# Altium footprint library AHMET_CAN_KARACAN.PcbL.PcbLib: 65 footprints (part 1 of 5)
Each footprint in its own frame and in the unit in brackets; x right, y up, seen from the top. Pads: shape width x height; smd on the part's side, far side on the other; paste and mask are expansions set on the pad; w line width, h text height; cw(c..) or ccw(c..) is an arc to the next point about the centre after c.
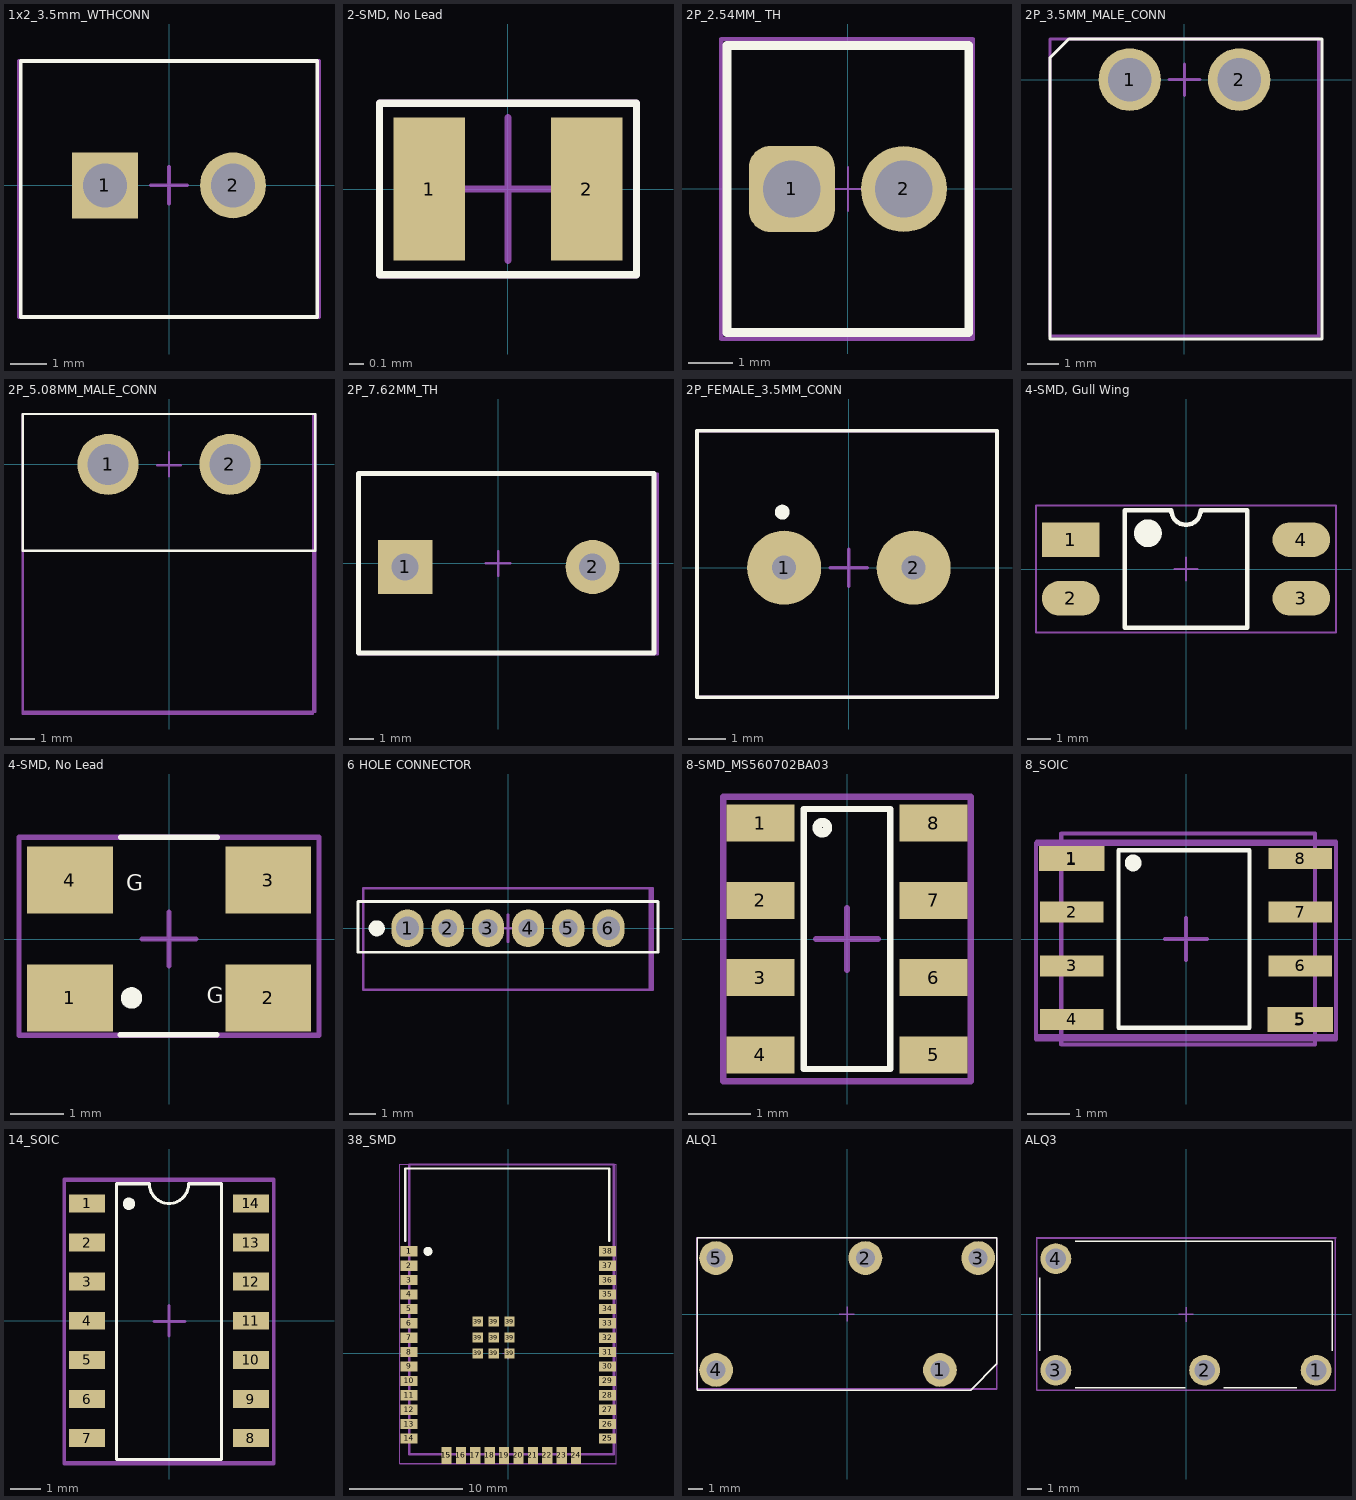
[diagram p0: the footprints below, top view; thin cyan lines are the x and y axes]

## 1x2_3.5mm_WTHCONN [mm]
pads (2):
  rect 1.8x1.8 hole 1.2: 1(-1.75,0)
  round 1.8 hole 1.2: 2(1.75,0)
Top Overlay:
  lines w0.1: -4.05,-3.6 4.05,-3.6 4.05,3.4 -4.05,3.4 -4.05,-3.6
Top Component Center:
  lines w0.1: -0.5,0 0.5,0 ; 0,-0.5 0,0.5 ; -4.1,-3.6 4.1,-3.6 4.1,3.4 -4.1,3.4 -4.1,-3.6
Top Designator:
  lines w0.1: -4.1,-3.6 -4.1,3.4 4.1,3.4 4.1,-3.6 -4.1,-3.6
  text ".Designator" at -2.25,-1.004 h2.54
3D body "CON_1x2_3.5mm.STEP": height 8.4, standoff -3.8, extent -4,-3.6 4,3.4

## 2-SMD, No Lead [mm]
pads (2):
  rect 0.5x1 smd mask+0.05: 1(-0.55,0) 2(0.55,0)
Top Overlay:
  lines w0.05: -0.9,-0.6 -0.9,0.6 0.9,0.6 0.9,-0.6 -0.9,-0.6
Top Component Center:
  lines w0.05: -0.5,0 0.5,0 ; 0,-0.5 0,0.5 ; -0.9,-0.6 -0.9,0.6 0.9,0.6 0.9,-0.6 -0.9,-0.6
Top Designator:
  lines w0.05: -0.9,-0.6 -0.9,0.6 0.9,0.6 0.9,-0.6 -0.9,-0.6
3D body "2_SMD_NO_LEAD.STEP": height 0.5, standoff 0, extent -0.8,-0.5 0.8,0.5

## 2P_2.54MM_ TH [mm]
pads (2):
  rrect50% 1.95x1.95 hole 1.3: 1(-1.27,0)
  round 1.95 hole 1.3: 2(1.27,0)
Top Overlay:
  lines w0.2: -2.74,-3.25 2.74,-3.25 2.74,3.25 -2.74,3.25 -2.74,-3.25
Top Component Center:
  lines w0.05: -0.5,0 0.5,0 ; 0,-0.5 0,0.5 ; -2.87,-3.3 2.83,-3.3 2.83,3.4 -2.87,3.4 -2.87,-3.3
Top Designator:
  lines w0.1: -2.87,-3.4 -2.87,3.4 2.83,3.4 2.83,-3.4 -2.87,-3.4
  text ".Designator" at -0.92,-0.283 h0.8
3D body "691210910002.stp": height 8.55, standoff -3.45, extent -2.74,-3.25 2.74,3.25

## 2P_3.5MM_MALE_CONN [mm]
pads (2):
  round 2 hole 1.4 mask+0.05: 1(-1.75,0) 2(1.75,0)
Top Overlay:
  lines w0.1: -4.3,-8.3 -4.3,0.7 -3.7,1.3 4.4,1.3 4.4,-8.3 -4.3,-8.3
Top Component Center:
  lines w0.1: -0.5,0 0.5,0 ; 0,-0.5 0,0.5 ; -4.3,-8.2 4.3,-8.2 4.3,1.3 -4.3,1.3 -4.3,-8.2
Top Designator:
  lines w0.1: -4.3,-8.2 4.3,-8.2 4.3,1.3 -4.3,1.3 -4.3,-8.2
  text ".Designator" at -0.95,-0.417 h1
3D body "2P_3.5MM_MALE_CONN.stp": height 7.35, standoff -3.35, extent -4.2,-8 4.2,1.2

## 2P_5.08MM_MALE_CONN [mm]
pads (2):
  round 2.55 hole 1.7: 1(-2.54,0) 2(2.54,0)
Top Overlay:
  lines w0.1: -6.1,-3.6 -6.1,2.1 6.1,2.1 6.1,-3.6 -6.1,-3.6
Top Component Center:
  lines w0.1: -0.499,-0.032 0.501,-0.032 ; 0,-0.5 0,0.5 ; -6.1,-10.4 -6.1,2.1 6,2.1 6,-10.4 -6.1,-10.4
Top Designator:
  lines w0.1: -6.1,-10.3 -6.1,2.1 6.1,2.1 6.1,-10.3 -6.1,-10.3
  text ".Designator" at -2.046,-0.638 h1.52
3D body "TBP01R1_508_02BE.step": height 8.55, standoff -3.95, extent -5.9,-10.1 5.86,1.9

## 2P_7.62MM_TH [mm]
pads (2):
  rect 2.2x2.2 hole 1.1: 1(-3.78,-0.143)
  round 2.2 hole 1.1: 2(3.84,-0.143)
Top Overlay:
  lines w0.2: -5.685,-3.643 -5.685,3.657 6.345,3.657 6.345,3.272 6.345,2.242 6.345,-1.463 6.345,-2.143 6.345,-3.643 -5.685,-3.643
Top Component Center:
  lines w0.1: -0.5,0 0.5,0 ; 0,-0.5 0,0.5 ; -5.685,-3.7 6.5,-3.7 6.5,-2.3 6.5,3.097 6.5,3.657 -5.685,3.657 -5.685,-3.7
Top Designator:
  lines w0.1: -5.7,-3.7 6.4,-3.7 6.4,3.6 -5.7,3.6 -5.7,-3.7
  text ".Designator" at -0.45,-0.283 h0.8
3D body "691214410002.stp": height 9.2, standoff -3.4, extent -5.685,-3.643 6.345,3.657

## 2P_FEMALE_3.5MM_CONN [mm]
pads (2):
  round 2 hole 0.65: 1(-1.75,0) 2(1.75,0)
Top Overlay:
  circle w0.2: c-1.8,1.5 r0.1
  lines w0.1: -4.1,-3.5 -4.1,3.7 4,3.7 4,-3.5 -4.1,-3.5
Top Component Center:
  lines w0.1: -0.5,0 0.5,0 ; 0,-0.5 0,0.5 ; -4.1,-3.5 4,-3.5 4,3.7 -4.1,3.7 -4.1,-3.5
Top Designator:
  lines w0.1: -4.1,-3.5 4,-3.5 4,3.7 -4.1,3.7 -4.1,-3.5
  text ".Designator" at -1.55,-0.417 h1
3D body "terminal_blocks_a-tb350-te02.stp": height 8.9, standoff -3.29, extent -4.05,-3.4 3.944,3.6

## 4-SMD, Gull Wing [mm]
pads (4):
  rect 2.5x1.5 smd: 1(-5,1.27)
  oval 2.5x1.5 smd: 2(-5,-1.27) 3(5,-1.27) 4(5,1.27)
Top Overlay:
  circle w0.6: c-1.65,1.55 r0.3
  lines w0.2: -2.65,-2.55 -2.65,2.55 -0.635,2.55 ccw(c0,2.55) 0.635,2.55 2.65,2.55 2.65,-2.55 -2.65,-2.55
Top Component Center:
  lines w0.1: -0.5,0 0.5,0 ; 0,-0.5 0,0.5 ; -6.5,-2.75 6.5,-2.75 6.5,2.75 -6.5,2.75 -6.5,-2.75
Top Designator:
  lines w0.1: -6.5,-2.75 6.5,-2.75 6.5,2.75 -6.5,2.75 -6.5,-2.75
  text ".Designator" at -0.75,-0.233 h0.8
3D body "TPC817S1A_RAG.stp": height 3.88, standoff 0, extent -5.127,-2.314 4.923,2.286

## 4-SMD, No Lead [mm]
pads (4):
  rect 1.6x1.25 smd mask+0.05: 1(-1.85,-1.1) 2(1.85,-1.1) 3(1.85,1.1) 4(-1.85,1.1)
Top Overlay:
  circle w0.2: c-0.7,-1.1 r0.1
  lines w0.1: -0.907,-1.788 0.893,-1.788 ; -0.9,1.9 0.9,1.9
  text "G" at -0.8,0.9 h0.3
  text "G" at 0.7,-1.2 h0.3
Top Component Center:
  lines w0.1: -0.5,0 0.5,0 ; 0,-0.5 0,0.5 ; -2.8,-1.8 -2.8,1.9 2.8,1.9 2.8,-1.8 -2.8,-1.8
Top Designator:
  lines w0.1: -2.8,-1.8 -2.8,1.9 2.8,1.9 2.8,-1.8 -2.8,-1.8
  text ".Designator" at -0.88,-0.33 h0.75
3D body "4_SMD_NO_LEAD.STEP": height 0.85, standoff 0, extent -2.5,-1.6 2.5,1.6

## 6 HOLE CONNECTOR [mm] "1.5MM"
pads (6):
  oval 1.2x1.4 hole 0.87 mask+0.05: 1(-3.75,0) 6(3.75,0)
  oval 1.2x1.4 hole 0.7 mask+0.05: 2(-2.25,0) 3(-0.75,0) 4(0.75,0) 5(2.25,0)
Top Overlay:
  circle w0.3: c-4.9,0 r0.15
  lines w0.1: -5.6,-0.9 -5.6,1 5.6,1 5.6,-0.9 -5.6,-0.9
Top Component Center:
  lines w0.1: -0.5,0 0.5,0 ; 0,-0.5 0,0.5 ; -5.4,-2.3 -5.4,1.5 5.3,1.5 5.3,-2.3 -5.4,-2.3
Top Designator:
  lines w0.1: -5.4,-2.3 -5.4,1.5 5.4,1.5 5.4,-2.3 -5.4,-2.3
  text ".Designator" at -2.346,-0.838 h1.52
3D body "6_HOLE_CONN_1.5MM.stp": height 4.95, standoff -2.25, extent -5.25,-1.3 5.25,2.2

## 8-SMD_MS560702BA03 [mm] "TSQFP, 48-Leads, Body 7,00x7,00mm, Pitch 0,50mm, IPC Medium Density"
height 1.6
pads (8):
  rect 1.1x0.6 smd mask+0.05: 1(-1.4,1.875) 2(-1.4,0.625) 3(-1.4,-0.625) 4(-1.4,-1.875) 5(1.4,-1.875) 6(1.4,-0.625) 7(1.4,0.625) 8(1.4,1.875)
Top Overlay:
  circle w0.15: c-0.4,1.8 r0.085
  lines w0.1: -0.7,-2.1 0.7,-2.1 0.7,2.1 -0.7,2.1 -0.7,-2.1
Top Component Center:
  lines w0.1: -0.5,0 0.5,0 ; 0,-0.5 0,0.5 ; -2,-2.3 2,-2.3 2,2.3 -2,2.3 -2,-2.3
Top Designator:
  lines w0.1: -2,-2.3 2,-2.3 2,2.3 -2,2.3 -2,-2.3
  text ".Designator" at -1.15,-0.65 h1.5
3D body "MS560702BA03-50--3DModel-STEP-1.STEP": height 0.98, standoff 0.03, extent -1.5,-2.5 1.5,2.5

## 8_SOIC [mm]
pads (10):
  rect 1.5x0.5 smd mask+0.05: 1(-2.7,1.905) 2(-2.7,0.635) 3(-2.7,-0.635) 4(-2.7,-1.905) 5(2.7,-1.905) 6(2.7,-0.635) 7(2.7,0.635) 8(2.7,1.905)
  rect 1.55x0.6 smd mask+0.05: 1(-2.7,1.905) 5(2.7,-1.905)
Top Overlay:
  circle w0.254: c-1.25,1.8 r0.071
  lines w0.1: -1.5,2.1 -1.6,2.1 ; -1.6,2.1 -1.6,-2.1 1.5,-2.1 1.5,2.1 -1.6,2.1
Top 3D Body:
  lines w0.1: -2.95,-2.5 3.05,-2.5 3.05,-1.25 3.05,1.25 3.05,2.5 -2.9,2.5 -2.95,2.5 -2.95,-2.5
Top Component Center:
  lines w0.1: -3.55,-2.325 -3.55,-1.188 -3.55,1.087 -3.55,2.225 ; -3.55,-2.3 3.55,-2.3 3.55,2.25 -3.55,2.25 ; -0.5,0 0.5,0 ; 0,-0.5 0,0.5
Top Designator:
  circle w0.254: c-2.8,1.9 r0.112
  lines w0.1: -3.55,-2.375 -3.55,-1.213 -3.55,1.112 -3.55,2.275 -3.525,2.3 3.55,2.3 3.55,1.138 3.55,-1.188 3.55,-2.375 -3.55,-2.375
  text ".Designator" at -0.896,-0.313 h1
3D body "SOIC_8.STEP": height 1.74, standoff -0.01, extent -2.997,-2.451 2.997,2.451

## 14_SOIC [mm]
pads (16):
  rect 1.18x0.58 smd mask+0.05: 1(-2.66,3.81) 1(-2.66,3.81) 2(-2.66,2.54) 3(-2.66,1.27) 4(-2.66,0) 5(-2.66,-1.27) 6(-2.66,-2.54) 7(-2.66,-3.81) 8(2.66,-3.81) 9(2.66,-2.54) 10(2.66,-1.27) 11(2.66,0) 12(2.66,1.27) 13(2.66,2.54) 14(2.66,3.81) 14(2.66,3.81)
Top Overlay:
  circle w0.2: c-1.3,3.8 r0.1
  lines w0.1: -1.7,-4.5 -1.7,4.45 -0.64,4.45 ccw(c0,4.45) 0.64,4.45 1.7,4.45 1.7,-4.5 -1.7,-4.5
Top Component Center:
  lines w0.1: -0.488,-0.021 0.512,-0.021 ; 0,-0.5 0,0.5 ; -3.4,-4.65 -3.4,4.55 3.4,4.55 3.4,-4.65 -3.4,-4.65
Top Designator:
  lines w0.1: -3.4,-4.6 -3.4,4.6 3.4,4.6 3.4,-4.6 -3.4,-4.6
  text ".Designator" at -1.346,-0.538 h1.52
3D body "SOIC_14.STEP": height 1.5, standoff 0, extent -3.05,-4.525 2.95,4.425

## 38_SMD [mm]
pads (50):
  rect 1.5x0.9 smd mask+0.05: 1(-8.75,9.005) 1(-8.75,9.005) 2(-8.75,7.735) 3(-8.75,6.465) 4(-8.75,5.195) 5(-8.75,3.925) 6(-8.75,2.655) 7(-8.75,1.385) 8(-8.75,0.115) 9(-8.75,-1.155) 10(-8.75,-2.425) 11(-8.75,-3.695) 12(-8.75,-4.965) 13(-8.75,-6.235) 14(-8.75,-7.505) 25(8.75,-7.505) 25(8.75,-7.505) 26(8.75,-6.235) 27(8.75,-4.965) 28(8.75,-3.695) 29(8.75,-2.425) 30(8.75,-1.155) 31(8.75,0.115) 32(8.75,1.385) 33(8.75,2.655) 34(8.75,3.925) 35(8.75,5.195) 36(8.75,6.465) 37(8.75,7.735) 38(8.75,9.005)
  rect 0.9x1.5 smd mask+0.05: 15(-5.465,-9.005) 15(-5.465,-9.005) 16(-4.195,-9.005) 17(-2.925,-9.005) 18(-1.655,-9.005) 19(-0.385,-9.005) 20(0.885,-9.005) 21(2.155,-9.005) 22(3.425,-9.005) 23(4.695,-9.005) 24(5.965,-9.005)
  rect 0.9x0.9 smd mask+0.05: 39(-2.7,0) 39(-2.7,1.4) 39(-2.7,2.8) 39(-1.3,0) 39(-1.3,1.4) 39(-1.3,2.8) 39(0.1,0) 39(0.1,1.4) 39(0.1,2.8)
Top Overlay:
  circle w0.4: c-7.1,9 r0.2
  lines w0.2: -9.1,9.9 -9.1,16.3 8.9,16.3 8.9,9.9
Top 3D Body:
  lines w0.2: -8.775,16.655 -8.74,16.655 ; -8.74,16.655 -8.74,-8.89 9.275,-8.89 9.275,16.655 -8.74,16.655
Top Component Center:
  lines w0.1: -0.5,0 0.5,0 ; 0,-0.5 0,0.5 0,0 ; -9.6,-9.75 -9.6,16.675 9.52,16.675 9.52,-9.75 -9.6,-9.75
Top Designator:
  lines w0.1: -9.6,-9.7 9.5,-9.7 9.5,16.7 -9.6,16.7 -9.6,-9.7
  text ".Designator" at -1.146,-0.738 h1.52
3D body "ESP32-WROOM-32E-N4.STEP": height 3.25, standoff 0, extent -8.705,-8.94 9.295,16.56

## ALQ1 [mm]
pads (5):
  round 2.3 hole 1.3 mask+0.05: 1(6.32,-3.81) 2(1.24,3.81) 3(8.92,3.81) 4(-8.92,-3.81) 5(-8.92,3.81)
Top Overlay:
  lines w0.1: -10.2,-5.2 8.4,-5.2 10.2,-3.4 10.2,5.2 -10.2,5.2 -10.2,-5.2
Top Component Center:
  lines w0.1: -0.527,-0.009 0.473,-0.009 ; 0,-0.5 0,0.5 ; -10.22,-5.11 -10.22,5.19 10.18,5.19 10.18,-5.11 -10.22,-5.11
Top Designator:
  lines w0.1: -10.2,-5.1 -10.2,5.2 10.2,5.2 10.2,-5.1 -10.2,-5.1
  text ".Designator" at -1.646,-0.638 h1.52
3D body: height 0.4, standoff -3.8, extent 6.17,-4.21 6.47,-3.41
3D body: height 15.6, standoff 0.4, extent -10.03,-5.02 9.97,4.98
3D body: height 15.6, standoff 0.4, extent 8.27,-3.92 8.87,-3.32
3D body: height 0.4, standoff -3.8, extent 8.77,3.41 9.07,4.21
3D body: height 0.4, standoff -3.8, extent 1.09,3.41 1.39,4.21
3D body: height 0.8, standoff -3.4, extent -9.42,-4.31 -8.42,-3.31
3D body: height 0.8, standoff -3.4, extent -9.42,3.31 -8.42,4.31

## ALQ3 [mm]
pads (4):
  round 2.1 hole 1.4: 1(8.89,-3.81) 2(1.27,-3.81) 3(-8.89,-3.81) 4(-8.89,3.81)
Top Overlay:
  lines w0.1: -10,-2.5 -10,2.5 ; -7.58,-5 -0.045,-5 ; -7.58,5 10,5 10,-2.5 ; 2.57,-5 7.58,-5
Top Component Center:
  lines w0.1: -10.25,5.25 10.25,5.25 ; -0.5,0 0.5,0 ; 0,-0.5 0,0.5 ; -10.2,-5.2 10.2,-5.2 10.2,5.2 -10.2,5.2 -10.2,-5.2
Top Designator:
  lines w0.1: -10.2,-5.2 -10.2,5.2 10.2,5.2 10.2,-5.2 -10.2,-5.2
  text ".Designator" at -4.7,-0.954 h2.54
3D body "ALQ312.STEP": height 16.1, standoff -3.7, extent -10.1,-5 9.9,5